# Altium footprint library Connectors THD.PcbLib: 631 footprints (part 2 of 46)
Each footprint in its own frame and in the unit in brackets; x right, y up, seen from the top. Pads: shape width x height; smd on the part's side, far side on the other; paste and mask are expansions set on the pad; w line width, h text height; cw(c..) or ccw(c..) is an arc to the next point about the centre after c.
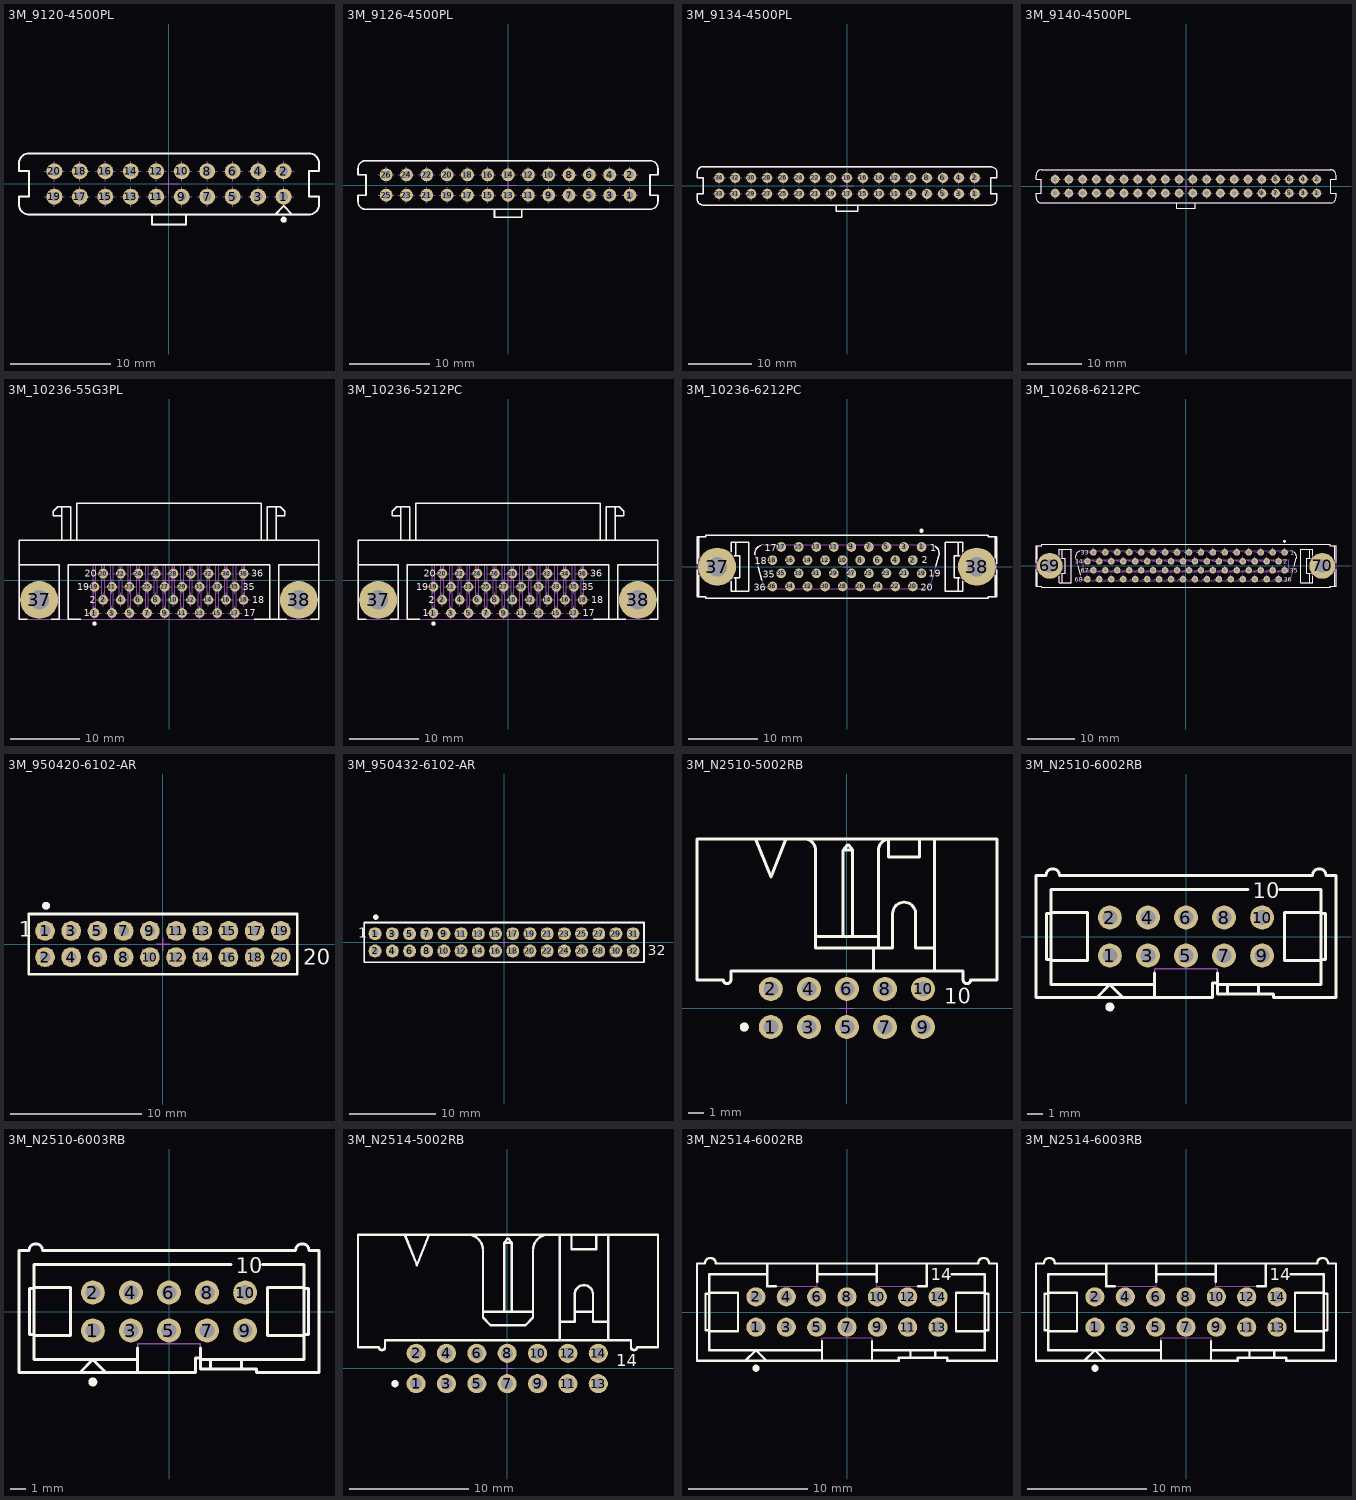
[diagram p1: the footprints below, top view; thin cyan lines are the x and y axes]

## 3M_9120-4500PL [mm] "20 Contacts - Straight .100\" x .100\" Polarized Boardmount Socket, 9100 Series"
height 9
pads (20):
  round 1.6 hole 0.9: 1(11.43,-1.27) 2(11.43,1.27) 3(8.89,-1.27) 4(8.89,1.27) 5(6.35,-1.27) 6(6.35,1.27) 7(3.81,-1.27) 8(3.81,1.27) 9(1.27,-1.27) 10(1.27,1.27) 11(-1.27,-1.27) 12(-1.27,1.27) 13(-3.81,-1.27) 14(-3.81,1.27) 15(-6.35,-1.27) 16(-6.35,1.27) 17(-8.89,-1.27) 18(-8.89,1.27) 19(-11.43,-1.27) 20(-11.43,1.27)
Top Overlay:
  circle w0.3: c11.43,-3.556 r0.15
  lines w0.2: -1.7,-3.05 -1.7,-4.05 1.7,-4.05 1.7,-3.05 ; -14.95,-2.05 ccw(c-13.95,-2.05) -13.95,-3.05 13.95,-3.05 ccw(c13.95,-2.05) 14.95,-2.05 14.95,-1.27 13.95,-1.27 13.95,1.27 14.95,1.27 14.95,2.05 ccw(c13.95,2.05) 13.95,3.05 -13.95,3.05 ccw(c-13.95,2.05) -14.95,2.05 -14.95,1.27 -13.95,1.27 -13.95,-1.27 -14.95,-1.27 -14.95,-2.05 ; 10.566,-3.05 11.43,-2.186 12.294,-3.05 10.566,-3.05
Mechanical 8:
  lines w0.1: -12.43,-1.27 -11.43,-1.27 ; -12.43,1.27 -11.43,1.27 ; -11.43,-2.27 -11.43,-1.27 ; -11.43,-0.27 -11.43,-1.27 ; -11.43,0.27 -11.43,1.27 ; -11.43,2.27 -11.43,1.27 ; -10.43,-1.27 -11.43,-1.27 ; -10.43,1.27 -11.43,1.27 ; -9.89,-1.27 -8.89,-1.27 ; -9.89,1.27 -8.89,1.27 ; -8.89,-2.27 -8.89,-1.27 ; -8.89,-0.27 -8.89,-1.27 ; -8.89,0.27 -8.89,1.27 ; -8.89,2.27 -8.89,1.27 ; -7.89,-1.27 -8.89,-1.27 ; -7.89,1.27 -8.89,1.27 ; -7.35,-1.27 -6.35,-1.27 ; -7.35,1.27 -6.35,1.27 ; -6.35,-2.27 -6.35,-1.27 ; -6.35,-0.27 -6.35,-1.27 ; -6.35,0.27 -6.35,1.27 ; -6.35,2.27 -6.35,1.27 ; -5.35,-1.27 -6.35,-1.27 ; -5.35,1.27 -6.35,1.27 ; -4.81,-1.27 -3.81,-1.27 ; -4.81,1.27 -3.81,1.27 ; -3.81,-2.27 -3.81,-1.27 ; -3.81,-0.27 -3.81,-1.27 ; -3.81,0.27 -3.81,1.27 ; -3.81,2.27 -3.81,1.27 ; -2.81,-1.27 -3.81,-1.27 ; -2.81,1.27 -3.81,1.27 ; -2.27,-1.27 -1.27,-1.27 ; -2.27,1.27 -1.27,1.27 ; -1.27,-2.27 -1.27,-1.27 ; -1.27,-0.27 -1.27,-1.27 ; -1.27,0.27 -1.27,1.27 ; -1.27,2.27 -1.27,1.27 ; -1,0 0,0 ; -0.27,-1.27 -1.27,-1.27 ; -0.27,1.27 -1.27,1.27 ; 0,-1 0,0 ; 0,1 0,0 ; 0.27,-1.27 1.27,-1.27 ; 0.27,1.27 1.27,1.27 ; 1,0 0,0 ; 1.27,-2.27 1.27,-1.27 ; 1.27,-0.27 1.27,-1.27 ; 1.27,0.27 1.27,1.27 ; 1.27,2.27 1.27,1.27 ; 2.27,-1.27 1.27,-1.27 ; 2.27,1.27 1.27,1.27 ; 2.81,-1.27 3.81,-1.27 ; 2.81,1.27 3.81,1.27 ; 3.81,-2.27 3.81,-1.27 ; 3.81,-0.27 3.81,-1.27 ; 3.81,0.27 3.81,1.27 ; 3.81,2.27 3.81,1.27 ; 4.81,-1.27 3.81,-1.27 ; 4.81,1.27 3.81,1.27 ; 5.35,-1.27 6.35,-1.27 ; 5.35,1.27 6.35,1.27 ; 6.35,-2.27 6.35,-1.27 ; 6.35,-0.27 6.35,-1.27 ; 6.35,0.27 6.35,1.27 ; 6.35,2.27 6.35,1.27 ; 7.35,-1.27 6.35,-1.27 ; 7.35,1.27 6.35,1.27 ; 7.89,-1.27 8.89,-1.27 ; 7.89,1.27 8.89,1.27 ; 8.89,-2.27 8.89,-1.27 ; 8.89,-0.27 8.89,-1.27 ; 8.89,0.27 8.89,1.27 ; 8.89,2.27 8.89,1.27 ; 9.89,-1.27 8.89,-1.27 ; 9.89,1.27 8.89,1.27 ; 10.43,-1.27 11.43,-1.27 ; 10.43,1.27 11.43,1.27 ; 11.43,-2.27 11.43,-1.27 ; 11.43,-0.27 11.43,-1.27 ; 11.43,0.27 11.43,1.27 ; 11.43,2.27 11.43,1.27 ; 12.43,-1.27 11.43,-1.27 ; 12.43,1.27 11.43,1.27
Mechanical 14:
  circle w0.3: c11.43,-3.556 r0.15
  lines w0.1: 10.566,-3.05 11.43,-2.186 12.294,-3.05 ; -14.95,-2.05 ccw(c-13.95,-2.05) -13.95,-3.05 13.95,-3.05 ccw(c13.95,-2.05) 14.95,-2.05 14.95,-1.27 13.95,-1.27 13.95,1.27 14.95,1.27 14.95,2.05 ccw(c13.95,2.05) 13.95,3.05 -13.95,3.05 ccw(c-13.95,2.05) -14.95,2.05 -14.95,1.27 -13.95,1.27 -13.95,-1.27 -14.95,-1.27 ; -14.95,-2.05 -14.95,-1.27 ; -14.95,-2.05 -14.95,-1.27 ; -1.7,-4.05 -1.7,-3.05 1.7,-3.05 1.7,-4.05 -1.7,-4.05
3D body: height 9, standoff -2.8, extent -14.95,-4.05 14.95,3.05

## 3M_9126-4500PL [mm] "26 Contacts - Straight .100\" x .100\" Polarized Boardmount Socket, 9100 Series"
height 9
pads (26):
  round 1.6 hole 0.9: 1(15.24,-1.27) 2(15.24,1.27) 3(12.7,-1.27) 4(12.7,1.27) 5(10.16,-1.27) 6(10.16,1.27) 7(7.62,-1.27) 8(7.62,1.27) 9(5.08,-1.27) 10(5.08,1.27) 11(2.54,-1.27) 12(2.54,1.27) 13(0,-1.27) 14(0,1.27) 15(-2.54,-1.27) 16(-2.54,1.27) 17(-5.08,-1.27) 18(-5.08,1.27) 19(-7.62,-1.27) 20(-7.62,1.27) 21(-10.16,-1.27) 22(-10.16,1.27) 23(-12.7,-1.27) 24(-12.7,1.27) 25(-15.24,-1.27) 26(-15.24,1.27)
Top Overlay:
  lines w0.2: -1.7,-3.05 -1.7,-4.05 1.7,-4.05 1.7,-3.05 ; -18.76,-2.05 ccw(c-17.76,-2.05) -17.76,-3.05 17.74,-3.05 ccw(c17.74,-2.05) 18.74,-2.05 18.74,-1.27 17.74,-1.27 17.74,1.27 18.74,1.27 18.74,2.05 ccw(c17.74,2.05) 17.74,3.05 -17.76,3.05 ccw(c-17.76,2.05) -18.76,2.05 -18.76,1.27 -17.76,1.27 -17.76,-1.27 -18.76,-1.27 ; -18.76,-2.05 -18.76,-1.27 ; -18.76,-2.05 -18.76,-1.27
Mechanical 8:
  lines w0.1: -16.24,-1.27 -15.24,-1.27 ; -16.24,1.27 -15.24,1.27 ; -15.24,-2.27 -15.24,-1.27 ; -15.24,-0.27 -15.24,-1.27 ; -15.24,0.27 -15.24,1.27 ; -15.24,2.27 -15.24,1.27 ; -14.24,-1.27 -15.24,-1.27 ; -14.24,1.27 -15.24,1.27 ; -13.7,-1.27 -12.7,-1.27 ; -13.7,1.27 -12.7,1.27 ; -12.7,-2.27 -12.7,-1.27 ; -12.7,-0.27 -12.7,-1.27 ; -12.7,0.27 -12.7,1.27 ; -12.7,2.27 -12.7,1.27 ; -11.7,-1.27 -12.7,-1.27 ; -11.7,1.27 -12.7,1.27 ; -11.16,-1.27 -10.16,-1.27 ; -11.16,1.27 -10.16,1.27 ; -10.16,-2.27 -10.16,-1.27 ; -10.16,-0.27 -10.16,-1.27 ; -10.16,0.27 -10.16,1.27 ; -10.16,2.27 -10.16,1.27 ; -9.16,-1.27 -10.16,-1.27 ; -9.16,1.27 -10.16,1.27 ; -8.62,-1.27 -7.62,-1.27 ; -8.62,1.27 -7.62,1.27 ; -7.62,-2.27 -7.62,-1.27 ; -7.62,-0.27 -7.62,-1.27 ; -7.62,0.27 -7.62,1.27 ; -7.62,2.27 -7.62,1.27 ; -6.62,-1.27 -7.62,-1.27 ; -6.62,1.27 -7.62,1.27 ; -6.08,-1.27 -5.08,-1.27 ; -6.08,1.27 -5.08,1.27 ; -5.08,-2.27 -5.08,-1.27 ; -5.08,-0.27 -5.08,-1.27 ; -5.08,0.27 -5.08,1.27 ; -5.08,2.27 -5.08,1.27 ; -4.08,-1.27 -5.08,-1.27 ; -4.08,1.27 -5.08,1.27 ; -3.54,-1.27 -2.54,-1.27 ; -3.54,1.27 -2.54,1.27 ; -2.54,-2.27 -2.54,-1.27 ; -2.54,-0.27 -2.54,-1.27 ; -2.54,0.27 -2.54,1.27 ; -2.54,2.27 -2.54,1.27 ; -1.54,-1.27 -2.54,-1.27 ; -1.54,1.27 -2.54,1.27 ; -1,-1.27 0,-1.27 ; -1,0 0,0 ; -1,1.27 0,1.27 ; 0,-2.27 0,-1.27 ; 0,-1 0,0 ; 0,-0.27 0,-1.27 ; 0,0.27 0,1.27 ; 0,1 0,0 ; 0,2.27 0,1.27 ; 1,-1.27 0,-1.27 ; 1,0 0,0 ; 1,1.27 0,1.27 ; 1.54,-1.27 2.54,-1.27 ; 1.54,1.27 2.54,1.27 ; 2.54,-2.27 2.54,-1.27 ; 2.54,-0.27 2.54,-1.27 ; 2.54,0.27 2.54,1.27 ; 2.54,2.27 2.54,1.27 ; 3.54,-1.27 2.54,-1.27 ; 3.54,1.27 2.54,1.27 ; 4.08,-1.27 5.08,-1.27 ; 4.08,1.27 5.08,1.27 ; 5.08,-2.27 5.08,-1.27 ; 5.08,-0.27 5.08,-1.27 ; 5.08,0.27 5.08,1.27 ; 5.08,2.27 5.08,1.27 ; 6.08,-1.27 5.08,-1.27 ; 6.08,1.27 5.08,1.27 ; 6.62,-1.27 7.62,-1.27 ; 6.62,1.27 7.62,1.27 ; 7.62,-2.27 7.62,-1.27 ; 7.62,-0.27 7.62,-1.27 ; 7.62,0.27 7.62,1.27 ; 7.62,2.27 7.62,1.27 ; 8.62,-1.27 7.62,-1.27 ; 8.62,1.27 7.62,1.27 ; 9.16,-1.27 10.16,-1.27 ; 9.16,1.27 10.16,1.27 ; 10.16,-2.27 10.16,-1.27 ; 10.16,-0.27 10.16,-1.27 ; 10.16,0.27 10.16,1.27 ; 10.16,2.27 10.16,1.27 ; 11.16,-1.27 10.16,-1.27 ; 11.16,1.27 10.16,1.27 ; 11.7,-1.27 12.7,-1.27 ; 11.7,1.27 12.7,1.27 ; 12.7,-2.27 12.7,-1.27 ; 12.7,-0.27 12.7,-1.27 ; 12.7,0.27 12.7,1.27 ; 12.7,2.27 12.7,1.27 ; 13.7,-1.27 12.7,-1.27 ; 13.7,1.27 12.7,1.27 ; 14.24,-1.27 15.24,-1.27 ; 14.24,1.27 15.24,1.27 ; 15.24,-2.27 15.24,-1.27 ; 15.24,-0.27 15.24,-1.27 ; 15.24,0.27 15.24,1.27 ; 15.24,2.27 15.24,1.27 ; 16.24,-1.27 15.24,-1.27 ; 16.24,1.27 15.24,1.27
Mechanical 14:
  lines w0.1: -1.7,-3.05 -1.7,-4.05 1.7,-4.05 1.7,-3.05 ; -18.76,-2.05 ccw(c-17.76,-2.05) -17.76,-3.05 17.74,-3.05 ccw(c17.74,-2.05) 18.74,-2.05 18.74,-1.27 17.74,-1.27 17.74,1.27 18.74,1.27 18.74,2.05 ccw(c17.74,2.05) 17.74,3.05 -17.76,3.05 ccw(c-17.76,2.05) -18.76,2.05 -18.76,1.27 -17.76,1.27 -17.76,-1.27 -18.76,-1.27 ; -18.76,-2.05 -18.76,-1.27 ; -18.76,-2.05 -18.76,-1.27
3D body: height 9, standoff -2.8, extent -18.76,-4.05 18.74,3.05

## 3M_9134-4500PL [mm] "34 Contacts - Straight .100\" x .100\" Polarized Boardmount Socket, 9100 Series"
height 9
pads (34):
  round 1.6 hole 0.9: 1(20.32,-1.27) 2(20.32,1.27) 3(17.78,-1.27) 4(17.78,1.27) 5(15.24,-1.27) 6(15.24,1.27) 7(12.7,-1.27) 8(12.7,1.27) 9(10.16,-1.27) 10(10.16,1.27) 11(7.62,-1.27) 12(7.62,1.27) 13(5.08,-1.27) 14(5.08,1.27) 15(2.54,-1.27) 16(2.54,1.27) 17(0,-1.27) 18(0,1.27) 19(-2.54,-1.27) 20(-2.54,1.27) 21(-5.08,-1.27) 22(-5.08,1.27) 23(-7.62,-1.27) 24(-7.62,1.27) 25(-10.16,-1.27) 26(-10.16,1.27) 27(-12.7,-1.27) 28(-12.7,1.27) 29(-15.24,-1.27) 30(-15.24,1.27) 31(-17.78,-1.27) 32(-17.78,1.27) 33(-20.32,-1.27) 34(-20.32,1.27)
Top Overlay:
  lines w0.2: -1.7,-3.05 -1.7,-4.05 1.7,-4.05 1.7,-3.05 ; -23.86,-2.05 ccw(c-22.86,-2.05) -22.86,-3.05 22.84,-3.05 ccw(c22.84,-2.05) 23.84,-2.05 23.84,-1.27 22.84,-1.27 22.84,1.27 23.84,1.27 23.84,2.05 ccw(c22.84,2.05) 22.84,3.05 -22.86,3.05 ccw(c-22.86,2.05) -23.86,2.05 -23.86,1.27 -22.86,1.27 -22.86,-1.27 -23.86,-1.27 ; -23.86,-2.05 -23.86,-1.27 ; -23.86,-2.05 -23.86,-1.27
Mechanical 8:
  lines w0.1: -21.32,-1.27 -20.32,-1.27 ; -21.32,1.27 -20.32,1.27 ; -20.32,-2.27 -20.32,-1.27 ; -20.32,-0.27 -20.32,-1.27 ; -20.32,0.27 -20.32,1.27 ; -20.32,2.27 -20.32,1.27 ; -19.32,-1.27 -20.32,-1.27 ; -19.32,1.27 -20.32,1.27 ; -18.78,-1.27 -17.78,-1.27 ; -18.78,1.27 -17.78,1.27 ; -17.78,-2.27 -17.78,-1.27 ; -17.78,-0.27 -17.78,-1.27 ; -17.78,0.27 -17.78,1.27 ; -17.78,2.27 -17.78,1.27 ; -16.78,-1.27 -17.78,-1.27 ; -16.78,1.27 -17.78,1.27 ; -16.24,-1.27 -15.24,-1.27 ; -16.24,1.27 -15.24,1.27 ; -15.24,-2.27 -15.24,-1.27 ; -15.24,-0.27 -15.24,-1.27 ; -15.24,0.27 -15.24,1.27 ; -15.24,2.27 -15.24,1.27 ; -14.24,-1.27 -15.24,-1.27 ; -14.24,1.27 -15.24,1.27 ; -13.7,-1.27 -12.7,-1.27 ; -13.7,1.27 -12.7,1.27 ; -12.7,-2.27 -12.7,-1.27 ; -12.7,-0.27 -12.7,-1.27 ; -12.7,0.27 -12.7,1.27 ; -12.7,2.27 -12.7,1.27 ; -11.7,-1.27 -12.7,-1.27 ; -11.7,1.27 -12.7,1.27 ; -11.16,-1.27 -10.16,-1.27 ; -11.16,1.27 -10.16,1.27 ; -10.16,-2.27 -10.16,-1.27 ; -10.16,-0.27 -10.16,-1.27 ; -10.16,0.27 -10.16,1.27 ; -10.16,2.27 -10.16,1.27 ; -9.16,-1.27 -10.16,-1.27 ; -9.16,1.27 -10.16,1.27 ; -8.62,-1.27 -7.62,-1.27 ; -8.62,1.27 -7.62,1.27 ; -7.62,-2.27 -7.62,-1.27 ; -7.62,-0.27 -7.62,-1.27 ; -7.62,0.27 -7.62,1.27 ; -7.62,2.27 -7.62,1.27 ; -6.62,-1.27 -7.62,-1.27 ; -6.62,1.27 -7.62,1.27 ; -6.08,-1.27 -5.08,-1.27 ; -6.08,1.27 -5.08,1.27 ; -5.08,-2.27 -5.08,-1.27 ; -5.08,-0.27 -5.08,-1.27 ; -5.08,0.27 -5.08,1.27 ; -5.08,2.27 -5.08,1.27 ; -4.08,-1.27 -5.08,-1.27 ; -4.08,1.27 -5.08,1.27 ; -3.54,-1.27 -2.54,-1.27 ; -3.54,1.27 -2.54,1.27 ; -2.54,-2.27 -2.54,-1.27 ; -2.54,-0.27 -2.54,-1.27 ; -2.54,0.27 -2.54,1.27 ; -2.54,2.27 -2.54,1.27 ; -1.54,-1.27 -2.54,-1.27 ; -1.54,1.27 -2.54,1.27 ; -1,-1.27 0,-1.27 ; -1,0 0,0 ; -1,1.27 0,1.27 ; 0,-2.27 0,-1.27 ; 0,-1 0,0 ; 0,-0.27 0,-1.27 ; 0,0.27 0,1.27 ; 0,1 0,0 ; 0,2.27 0,1.27 ; 1,-1.27 0,-1.27 ; 1,0 0,0 ; 1,1.27 0,1.27 ; 1.54,-1.27 2.54,-1.27 ; 1.54,1.27 2.54,1.27 ; 2.54,-2.27 2.54,-1.27 ; 2.54,-0.27 2.54,-1.27 ; 2.54,0.27 2.54,1.27 ; 2.54,2.27 2.54,1.27 ; 3.54,-1.27 2.54,-1.27 ; 3.54,1.27 2.54,1.27 ; 4.08,-1.27 5.08,-1.27 ; 4.08,1.27 5.08,1.27 ; 5.08,-2.27 5.08,-1.27 ; 5.08,-0.27 5.08,-1.27 ; 5.08,0.27 5.08,1.27 ; 5.08,2.27 5.08,1.27 ; 6.08,-1.27 5.08,-1.27 ; 6.08,1.27 5.08,1.27 ; 6.62,-1.27 7.62,-1.27 ; 6.62,1.27 7.62,1.27 ; 7.62,-2.27 7.62,-1.27 ; 7.62,-0.27 7.62,-1.27 ; 7.62,0.27 7.62,1.27 ; 7.62,2.27 7.62,1.27 ; 8.62,-1.27 7.62,-1.27 ; 8.62,1.27 7.62,1.27 ; 9.16,-1.27 10.16,-1.27 ; 9.16,1.27 10.16,1.27 ; 10.16,-2.27 10.16,-1.27 ; 10.16,-0.27 10.16,-1.27 ; 10.16,0.27 10.16,1.27 ; 10.16,2.27 10.16,1.27 ; 11.16,-1.27 10.16,-1.27 ; 11.16,1.27 10.16,1.27 ; 11.7,-1.27 12.7,-1.27 ; 11.7,1.27 12.7,1.27 ; 12.7,-2.27 12.7,-1.27 ; 12.7,-0.27 12.7,-1.27 ; 12.7,0.27 12.7,1.27 ; 12.7,2.27 12.7,1.27 ; 13.7,-1.27 12.7,-1.27 ; 13.7,1.27 12.7,1.27 ; 14.24,-1.27 15.24,-1.27 ; 14.24,1.27 15.24,1.27 ; 15.24,-2.27 15.24,-1.27 ; 15.24,-0.27 15.24,-1.27 ; 15.24,0.27 15.24,1.27 ; 15.24,2.27 15.24,1.27 ; 16.24,-1.27 15.24,-1.27 ; 16.24,1.27 15.24,1.27 ; 16.78,-1.27 17.78,-1.27 ; 16.78,1.27 17.78,1.27 ; 17.78,-2.27 17.78,-1.27 ; 17.78,-0.27 17.78,-1.27 ; 17.78,0.27 17.78,1.27 ; 17.78,2.27 17.78,1.27 ; 18.78,-1.27 17.78,-1.27 ; 18.78,1.27 17.78,1.27 ; 19.32,-1.27 20.32,-1.27 ; 19.32,1.27 20.32,1.27 ; 20.32,-2.27 20.32,-1.27 ; 20.32,-0.27 20.32,-1.27 ; 20.32,0.27 20.32,1.27 ; 20.32,2.27 20.32,1.27 ; 21.32,-1.27 20.32,-1.27 ; 21.32,1.27 20.32,1.27
Mechanical 14:
  lines w0.1: -1.7,-3.05 -1.7,-4.05 1.7,-4.05 1.7,-3.05 ; -23.86,-2.05 ccw(c-22.86,-2.05) -22.86,-3.05 22.84,-3.05 ccw(c22.84,-2.05) 23.84,-2.05 23.84,-1.27 22.84,-1.27 22.84,1.27 23.84,1.27 23.84,2.05 ccw(c22.84,2.05) 22.84,3.05 -22.86,3.05 ccw(c-22.86,2.05) -23.86,2.05 -23.86,1.27 -22.86,1.27 -22.86,-1.27 -23.86,-1.27 ; -23.86,-2.05 -23.86,-1.27 ; -23.86,-2.05 -23.86,-1.27
3D body: height 9, standoff -2.8, extent -23.86,-4.05 23.84,3.05

## 3M_9140-4500PL [mm] "40 Contacts - Straight .100\" x .100\" Polarized Boardmount Socket, 9100 Series"
height 9
pads (40):
  round 1.6 hole 0.9: 1(24.13,-1.27) 2(24.13,1.27) 3(21.59,-1.27) 4(21.59,1.27) 5(19.05,-1.27) 6(19.05,1.27) 7(16.51,-1.27) 8(16.51,1.27) 9(13.97,-1.27) 10(13.97,1.27) 11(11.43,-1.27) 12(11.43,1.27) 13(8.89,-1.27) 14(8.89,1.27) 15(6.35,-1.27) 16(6.35,1.27) 17(3.81,-1.27) 18(3.81,1.27) 19(1.27,-1.27) 20(1.27,1.27) 21(-1.27,-1.27) 22(-1.27,1.27) 23(-3.81,-1.27) 24(-3.81,1.27) 25(-6.35,-1.27) 26(-6.35,1.27) 27(-8.89,-1.27) 28(-8.89,1.27) 29(-11.43,-1.27) 30(-11.43,1.27) 31(-13.97,-1.27) 32(-13.97,1.27) 33(-16.51,-1.27) 34(-16.51,1.27) 35(-19.05,-1.27) 36(-19.05,1.27) 37(-21.59,-1.27) 38(-21.59,1.27) 39(-24.13,-1.27) 40(-24.13,1.27)
Top Overlay:
  lines w0.2: -1.69,-3.05 -1.69,-4.05 1.71,-4.05 1.71,-3.05 ; -27.65,-2.05 ccw(c-26.65,-2.05) -26.65,-3.05 26.65,-3.05 ccw(c26.65,-2.05) 27.65,-2.05 27.65,-1.27 26.65,-1.27 26.65,1.27 27.65,1.27 27.65,2.05 ccw(c26.65,2.05) 26.65,3.05 -26.65,3.05 ccw(c-26.65,2.05) -27.65,2.05 -27.65,1.27 -26.65,1.27 -26.65,-1.27 -27.65,-1.27 ; -27.65,-2.05 -27.65,-1.27 ; -27.65,-2.05 -27.65,-1.27
Mechanical 8:
  drawing of 164 lines, arcs and shapes, not listed
Mechanical 14:
  lines w0.1: -1.69,-3.05 -1.69,-4.05 1.71,-4.05 1.71,-3.05 ; -27.65,-2.05 ccw(c-26.65,-2.05) -26.65,-3.05 26.65,-3.05 ccw(c26.65,-2.05) 27.65,-2.05 27.65,-1.27 26.65,-1.27 26.65,1.27 27.65,1.27 27.65,2.05 ccw(c26.65,2.05) 26.65,3.05 -26.65,3.05 ccw(c-26.65,2.05) -27.65,2.05 -27.65,1.27 -26.65,1.27 -26.65,-1.27 -27.65,-1.27 ; -27.65,-2.05 -27.65,-1.27 ; -27.65,-2.05 -27.65,-1.27
3D body: height 9, standoff -2.8, extent -27.65,-4.05 27.65,3.05

## 3M_10236-55G3PL [mm] "36 contacts, Mini D Ribbon (MDR), 102 Series, .050\" Boardmount Through-hole Right Angle Receptacle-Shielded"
height 9.4
pads (38):
  round 1.4 hole 0.8: 1(-10.795,-4.758) 2(-9.525,-2.853) 3(-8.255,-4.758) 4(-6.985,-2.853) 5(-5.715,-4.758) 6(-4.445,-2.853) 7(-3.175,-4.758) 8(-1.905,-2.853) 9(-0.635,-4.758) 10(0.635,-2.853) 11(1.905,-4.758) 12(3.175,-2.853) 13(4.445,-4.758) 14(5.715,-2.853) 15(6.985,-4.758) 16(8.255,-2.853) 17(9.525,-4.758) 18(10.795,-2.853) 19(-10.795,-0.957) 20(-9.525,0.957) 21(-8.255,-0.957) 22(-6.985,0.957) 23(-5.715,-0.957) 24(-4.445,0.957) 25(-3.175,-0.957) 26(-1.905,0.957) 27(-0.635,-0.957) 28(0.635,0.957) 29(1.905,-0.957) 30(3.175,0.957) 31(4.445,-0.957) 32(5.715,0.957) 33(6.985,-0.957) 34(8.255,0.957) 35(9.525,-0.957) 36(10.795,0.957)
  round 5.5 hole 2.8: 37(-18.796,-2.853) 38(18.796,-2.853)
Top Overlay:
  circle w0.3: c-10.795,-6.282 r0.15
  lines w0.2: -21.717,2.227 -15.875,2.227 -15.875,-5.647 -17.084,-5.647 ; -20.508,-5.647 -21.717,-5.647 -21.717,5.783 21.717,5.783 21.717,-5.647 20.508,-5.647 ; -15.494,5.783 -15.494,10.609 ; -15.494,9.339 -16.764,9.339 -16.764,9.974 -16.129,10.609 -14.224,10.609 -14.224,5.783 ; -13.335,5.783 -13.335,11.117 13.334,11.117 13.336,5.783 ; -12.77,-5.647 -14.605,-5.647 -14.605,2.227 14.605,2.227 14.605,-5.647 ; 12.349,-5.647 15.875,-5.647 ; 14.224,5.783 14.224,10.609 16.129,10.609 16.764,9.974 16.764,9.339 15.494,9.339 ; 15.494,5.783 15.494,10.609 ; 17.084,-5.647 15.875,-5.647 ; 21.717,2.227 15.875,2.227 15.875,-5.647
  text "36" at 11.935,0.468 h1.02
  text "18" at 12.06,-3.342 h1.02
  text "17" at 10.8,-5.247 h1.02
  text "35" at 10.675,-1.446 h1.02
  text "19" at -13.315,-1.441 h1.02
  text "20" at -12.195,0.473 h1.02
  text "2" at -11.495,-3.337 h1.02
  text "1" at -12.365,-5.242 h1.02
Mechanical 8:
  drawing of 156 lines, arcs and shapes, not listed
Mechanical 14:
  circle w0.3: c-10.795,-6.282 r0.15
  lines w0.1: -21.717,2.227 -15.875,2.227 -15.875,-5.647 ; -15.494,5.783 -15.494,10.609 ; -15.494,9.339 -16.764,9.339 -16.764,9.974 -16.129,10.609 -14.224,10.609 -14.224,5.783 ; -14.605,-5.647 -14.605,2.227 14.605,2.227 14.605,-5.647 ; -13.335,5.783 -13.335,11.117 13.334,11.117 13.336,5.783 ; -10.994,2.227 -10.994,-4.957 -10.596,-4.957 -10.596,2.227 ; -9.724,2.227 -9.724,-3.052 -9.326,-3.052 -9.326,2.227 ; -8.454,2.227 -8.454,-4.957 -8.056,-4.957 -8.056,2.227 ; -7.184,2.227 -7.184,-3.052 -6.786,-3.052 -6.786,2.227 ; -5.914,2.227 -5.914,-4.957 -5.516,-4.957 -5.516,2.227 ; -4.644,2.227 -4.644,-3.052 -4.246,-3.052 -4.246,2.227 ; -3.374,2.227 -3.374,-4.957 -2.976,-4.957 -2.976,2.227 ; -2.104,2.227 -2.104,-3.052 -1.706,-3.052 -1.706,2.227 ; -0.834,2.227 -0.834,-4.957 -0.436,-4.957 -0.436,2.227 ; 0.436,2.227 0.436,-3.052 0.834,-3.052 0.834,2.227 ; 1.706,2.227 1.706,-4.957 2.104,-4.957 2.104,2.227 ; 2.976,2.227 2.976,-3.052 3.374,-3.052 3.374,2.227 ; 4.246,2.227 4.246,-4.957 4.644,-4.957 4.644,2.227 ; 5.516,2.227 5.516,-3.052 5.914,-3.052 5.914,2.227 ; 6.786,2.227 6.786,-4.957 7.184,-4.957 7.184,2.227 ; 8.056,2.227 8.056,-3.052 8.454,-3.052 8.454,2.227 ; 9.326,2.227 9.326,-4.957 9.724,-4.957 9.724,2.227 ; 10.596,2.227 10.596,-3.052 10.994,-3.052 10.994,2.227 ; 14.224,5.783 14.224,10.609 16.129,10.609 16.764,9.974 16.764,9.339 15.494,9.339 ; 15.494,5.783 15.494,10.609 ; 15.875,-5.647 15.875,2.227 21.717,2.227 ; -21.717,-5.647 -21.717,5.783 21.717,5.783 21.717,-5.647 -21.717,-5.647 ; -19.05,-5.031 -19.05,-4.071 cw(c-18.796,-2.853) -19.05,-1.634 -19.05,-0.675 -18.542,-0.675 -18.542,-1.634 cw(c-18.796,-2.853) -18.542,-4.071 -18.542,-5.031 -19.05,-5.031 ; 18.542,-5.031 18.542,-4.071 cw(c18.796,-2.853) 18.542,-1.634 18.542,-0.675 19.05,-0.675 19.05,-1.634 cw(c18.796,-2.853) 19.05,-4.071 19.05,-5.031 18.542,-5.031
  text "36" at 11.935,0.468 h1.02
  text "18" at 12.06,-3.342 h1.02
  text "17" at 10.8,-5.247 h1.02
  text "35" at 10.675,-1.446 h1.02
  text "19" at -13.315,-1.441 h1.02
  text "20" at -12.195,0.473 h1.02
  text "2" at -11.495,-3.337 h1.02
  text "1" at -12.365,-5.242 h1.02
3D body: height 9.4, standoff -3.81, extent -21.717,-5.647 21.717,11.117

## 3M_10236-5212PC [mm] "36 contacts, Mini D Ribbon (MDR), 102 Series, .050\" Boardmount Through-hole Right Angle Receptacle-Shielded"
height 9.4
pads (38):
  round 1.4 hole 0.8: 1(-10.795,-4.758) 2(-9.525,-2.853) 3(-8.255,-4.758) 4(-6.985,-2.853) 5(-5.715,-4.758) 6(-4.445,-2.853) 7(-3.175,-4.758) 8(-1.905,-2.853) 9(-0.635,-4.758) 10(0.635,-2.853) 11(1.905,-4.758) 12(3.175,-2.853) 13(4.445,-4.758) 14(5.715,-2.853) 15(6.985,-4.758) 16(8.255,-2.853) 17(9.525,-4.758) 18(10.795,-2.853) 19(-10.795,-0.957) 20(-9.525,0.957) 21(-8.255,-0.957) 22(-6.985,0.957) 23(-5.715,-0.957) 24(-4.445,0.957) 25(-3.175,-0.957) 26(-1.905,0.957) 27(-0.635,-0.957) 28(0.635,0.957) 29(1.905,-0.957) 30(3.175,0.957) 31(4.445,-0.957) 32(5.715,0.957) 33(6.985,-0.957) 34(8.255,0.957) 35(9.525,-0.957) 36(10.795,0.957)
  round 5.5 hole 2.8: 37(-18.796,-2.853) 38(18.796,-2.853)
Top Overlay:
  circle w0.3: c-10.795,-6.282 r0.15
  lines w0.2: -21.717,2.227 -15.875,2.227 -15.875,-5.647 -17.084,-5.647 ; -20.508,-5.647 -21.717,-5.647 -21.717,5.783 21.717,5.783 21.717,-5.647 20.508,-5.647 ; -15.494,5.783 -15.494,10.609 ; -15.494,9.339 -16.764,9.339 -16.764,9.974 -16.129,10.609 -14.224,10.609 -14.224,5.783 ; -13.335,5.783 -13.335,11.117 13.334,11.117 13.336,5.783 ; -12.77,-5.647 -14.605,-5.647 -14.605,2.227 14.605,2.227 14.605,-5.647 ; 12.349,-5.647 15.875,-5.647 ; 14.224,5.783 14.224,10.609 16.129,10.609 16.764,9.974 16.764,9.339 15.494,9.339 ; 15.494,5.783 15.494,10.609 ; 17.084,-5.647 15.875,-5.647 ; 21.717,2.227 15.875,2.227 15.875,-5.647
  text "1" at -12.365,-5.242 h1.02
  text "2" at -11.495,-3.337 h1.02
  text "20" at -12.195,0.473 h1.02
  text "19" at -13.315,-1.441 h1.02
  text "35" at 10.675,-1.446 h1.02
  text "17" at 10.8,-5.247 h1.02
  text "18" at 12.06,-3.342 h1.02
  text "36" at 11.935,0.468 h1.02
Mechanical 8:
  drawing of 156 lines, arcs and shapes, not listed
Mechanical 14:
  circle w0.3: c-10.795,-6.282 r0.15
  lines w0.1: -21.717,2.227 -15.875,2.227 -15.875,-5.647 ; -15.494,5.783 -15.494,10.609 ; -15.494,9.339 -16.764,9.339 -16.764,9.974 -16.129,10.609 -14.224,10.609 -14.224,5.783 ; -14.605,-5.647 -14.605,2.227 14.605,2.227 14.605,-5.647 ; -13.335,5.783 -13.335,11.117 13.334,11.117 13.336,5.783 ; -10.994,2.227 -10.994,-4.957 -10.596,-4.957 -10.596,2.227 ; -9.724,2.227 -9.724,-3.052 -9.326,-3.052 -9.326,2.227 ; -8.454,2.227 -8.454,-4.957 -8.056,-4.957 -8.056,2.227 ; -7.184,2.227 -7.184,-3.052 -6.786,-3.052 -6.786,2.227 ; -5.914,2.227 -5.914,-4.957 -5.516,-4.957 -5.516,2.227 ; -4.644,2.227 -4.644,-3.052 -4.246,-3.052 -4.246,2.227 ; -3.374,2.227 -3.374,-4.957 -2.976,-4.957 -2.976,2.227 ; -2.104,2.227 -2.104,-3.052 -1.706,-3.052 -1.706,2.227 ; -0.834,2.227 -0.834,-4.957 -0.436,-4.957 -0.436,2.227 ; 0.436,2.227 0.436,-3.052 0.834,-3.052 0.834,2.227 ; 1.706,2.227 1.706,-4.957 2.104,-4.957 2.104,2.227 ; 2.976,2.227 2.976,-3.052 3.374,-3.052 3.374,2.227 ; 4.246,2.227 4.246,-4.957 4.644,-4.957 4.644,2.227 ; 5.516,2.227 5.516,-3.052 5.914,-3.052 5.914,2.227 ; 6.786,2.227 6.786,-4.957 7.184,-4.957 7.184,2.227 ; 8.056,2.227 8.056,-3.052 8.454,-3.052 8.454,2.227 ; 9.326,2.227 9.326,-4.957 9.724,-4.957 9.724,2.227 ; 10.596,2.227 10.596,-3.052 10.994,-3.052 10.994,2.227 ; 14.224,5.783 14.224,10.609 16.129,10.609 16.764,9.974 16.764,9.339 15.494,9.339 ; 15.494,5.783 15.494,10.609 ; 15.875,-5.647 15.875,2.227 21.717,2.227 ; -21.717,-5.647 21.717,-5.647 21.717,5.783 -21.717,5.783 -21.717,-5.647 ; -19.05,-5.031 -18.542,-5.031 -18.542,-4.071 ccw(c-18.796,-2.853) -18.542,-1.634 -18.542,-0.675 -19.05,-0.675 -19.05,-1.634 ccw(c-18.796,-2.853) -19.05,-4.071 -19.05,-5.031 ; 18.542,-5.031 19.05,-5.031 19.05,-4.071 ccw(c18.796,-2.853) 19.05,-1.634 19.05,-0.675 18.542,-0.675 18.542,-1.634 ccw(c18.796,-2.853) 18.542,-4.071 18.542,-5.031
  text "1" at -12.365,-5.242 h1.02
  text "2" at -11.495,-3.337 h1.02
  text "20" at -12.195,0.473 h1.02
  text "19" at -13.315,-1.441 h1.02
  text "35" at 10.675,-1.446 h1.02